# Altium footprint library USER_Lib.PcbLib: 102 footprints (part 2 of 7)
Each footprint in its own frame and in the unit in brackets; x right, y up, seen from the top. Pads: shape width x height; smd on the part's side, far side on the other; paste and mask are expansions set on the pad; w line width, h text height; cw(c..) or ccw(c..) is an arc to the next point about the centre after c.
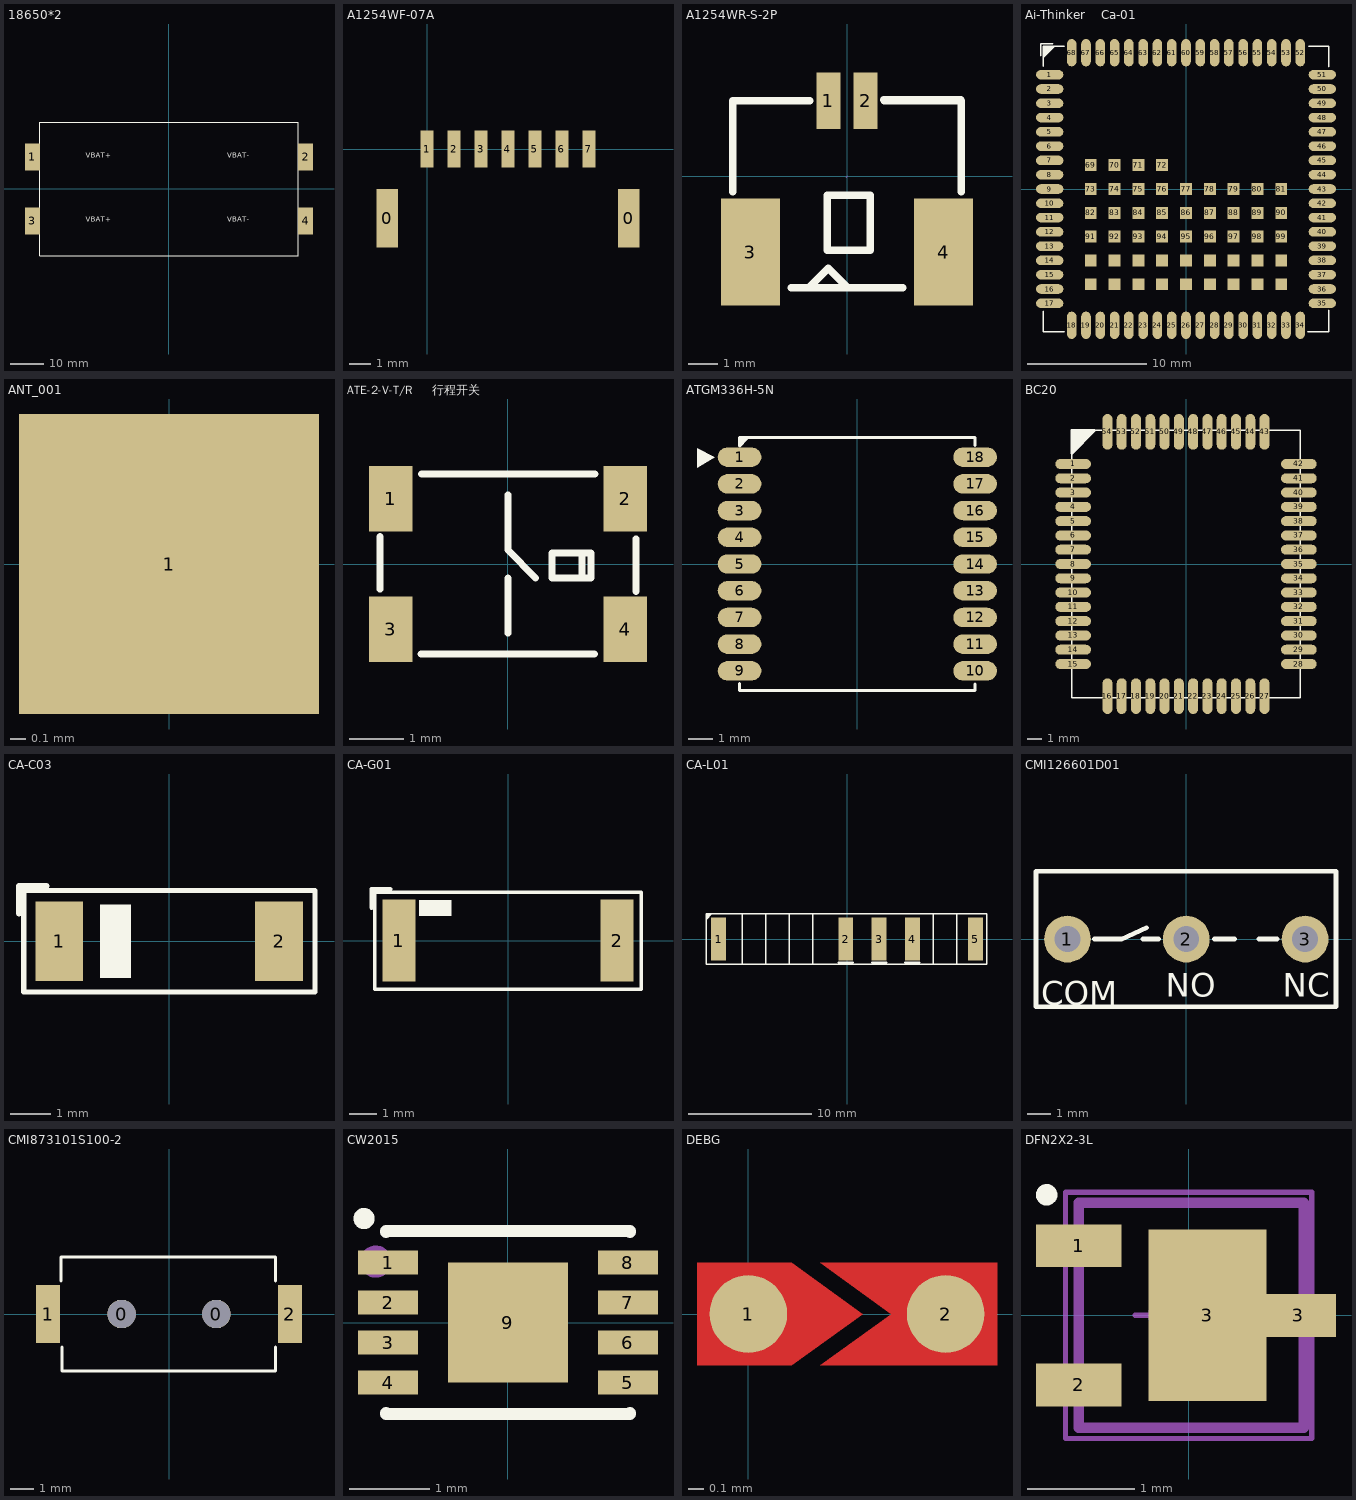
[diagram p1: the footprints below, top view; thin cyan lines are the x and y axes]

## 18650*2 [mm] "18650电池盒"
pads (4):
  rect 4.45x8 smd: 1(-40.775,9.55) 2(40.775,9.55) 3(-40.775,-9.55) 4(40.775,-9.55)
Top Overlay:
  lines w0.203: -38.55,-19.964 38.55,-19.964 38.55,19.95 -38.55,19.95 -38.55,-19.964
  text "VBAT+" at -24.88,8.736 h2.54
  text "VBAT-" at 17.405,8.736 h2.54
  text "VBAT+" at -24.88,-10.364 h2.54
  text "VBAT-" at 17.405,-10.364 h2.54

## A1254WF-07A [mm]
pads (9):
  rect 1x2.7 smd: 0(-1.85,-3.2) 0(9.35,-3.2)
  rect 0.6x1.7 smd: 1(0,0) 2(1.25,0) 3(2.5,0) 4(3.75,0) 5(5,0) 6(6.25,0) 7(7.5,0)
3D body "装配体2.STEP": height 4.45, standoff 0, extent -2.266,-4.533 9.734,0.198

## A1254WR-S-2P [mm] "长江连接器-卧式"
pads (4):
  rect 0.8x1.9 smd: 1(-0.625,2.55) 2(0.625,2.55)
  rect 2x3.6 smd: 3(-3.25,-2.55) 4(3.25,-2.55)
Top Overlay:
  lines w0.254: -1.875,-3.75 1.875,-3.75 ; -1.26,-3.711 -0.635,-3.086 -0.011,-3.711 ; 1.237,2.58 3.83,2.58 ; 1.256,2.55 3.849,2.55 ; -3.85,2.55 -3.85,-0.518 -3.85,2.55 ; -3.85,2.55 -1.257,2.55 -3.85,2.55 ; 3.849,2.55 3.849,-0.518 3.849,2.55 ; -0.665,-2.486 -0.665,-0.635 0.776,-0.635 0.776,-2.486 -0.665,-2.486
Mechanical 15:
  lines w0.003: -0.025,-0.033 0.025,0.018

## Ai-Thinker    Ca-01 [mm] "安信可4G物联网模块"
pads (117):
  oval 2.3x0.8 smd: 1(-11.45,9.6) 2(-11.45,8.4) 3(-11.45,7.2) 4(-11.45,6) 5(-11.45,4.8) 6(-11.45,3.6) 7(-11.45,2.4) 8(-11.45,1.2) 9(-11.45,0) 10(-11.45,-1.2) 11(-11.45,-2.4) 12(-11.45,-3.6) 13(-11.45,-4.8) 14(-11.45,-6) 15(-11.45,-7.2) 16(-11.45,-8.4) 17(-11.45,-9.6) 35(11.45,-9.6) 36(11.45,-8.4) 37(11.45,-7.2) 38(11.45,-6) 39(11.45,-4.8) 40(11.45,-3.6) 41(11.45,-2.4) 42(11.45,-1.2) 43(11.45,0) 44(11.45,1.2) 45(11.45,2.4) 46(11.45,3.6) 47(11.45,4.8) 48(11.45,6) 49(11.45,7.2) 50(11.45,8.4) 51(11.45,9.6)
  oval 0.8x2.3 smd: 18(-9.6,-11.45) 19(-8.4,-11.45) 20(-7.2,-11.45) 21(-6,-11.45) 22(-4.8,-11.45) 23(-3.6,-11.45) 24(-2.4,-11.45) 25(-1.2,-11.45) 26(0,-11.45) 27(1.2,-11.45) 28(2.4,-11.45) 29(3.6,-11.45) 30(4.8,-11.45) 31(6,-11.45) 32(7.2,-11.45) 33(8.4,-11.45) 34(9.6,-11.45) 52(9.6,11.45) 53(8.4,11.45) 54(7.2,11.45) 55(6,11.45) 56(4.8,11.45) 57(3.6,11.45) 58(2.4,11.45) 59(1.2,11.45) 60(0,11.45) 61(-1.2,11.45) 62(-2.4,11.45) 63(-3.6,11.45) 64(-4.8,11.45) 65(-6,11.45) 66(-7.2,11.45) 67(-8.4,11.45) 68(-9.6,11.45)
  rect 1x1 smd mask+0.102: 69(-8,2)
  rect 1x1 smd: 70(-6,2) 71(-4,2) 72(-2,2) 73(-8,0) 74(-6,0) 75(-4,0) 76(-2,0) 77(0,0) 78(2,0) 79(4,0) 80(6,0) 81(8,0) 82(-8,-2) 83(-6,-2) 84(-4,-2) 85(-2,-2) 86(0,-2) 87(2,-2) 88(4,-2) 89(6,-2) 90(8,-2) 91(-8,-4) 92(-6,-4) 93(-4,-4) 94(-2,-4) 95(0,-4) 96(2,-4) 97(4,-4) 98(6,-4) 99(8,-4) 100(-8,-6) 101(-6,-6) 102(-4,-6) 103(-2,-6) 104(0,-6) 105(2,-6) 106(4,-6) 107(6,-6) 108(8,-6) 109(-8,-8) 110(-6,-8) 111(-4,-8) 112(-2,-8) 113(0,-8) 114(2,-8) 115(4,-8) 116(6,-8) 117(8,-8)
Top Overlay:
  region: -12,12 -10.976,12 -12,10.976
  lines w0.127: -12.2,11.176 -12.2,12.2 -11.176,12.2 ; -12,-10.287 -12,-12 -10.218,-12 ; -12,10.302 -12,12 -10.248,12 ; 10.213,-12 12,-12 12,-10.204 ; 10.292,12 12,12 12,10.287
3D body "Ca-01.STEP": height 2.3, standoff 0, extent -12,-12 12,12

## ANT_001 [mm]
pads (1):
  rect 2x2 smd mask+0.102: 1(0,0)

## ATE-2-V-T/R     行程开关 [mm] "行程开关"
pads (4):
  rect 0.8x1.2 smd mask+0.102: 1(-2.15,1.2) 2(2.15,1.2) 3(-2.15,-1.2) 4(2.15,-1.2)
Top Overlay:
  lines w0.127: -2.35,-0.463 -2.35,0.508 ; -1.597,-1.65 0,-1.65 1.59,-1.65 ; -1.587,1.65 0,1.65 1.594,1.65 ; 0,-1.27 0,-0.254 ; 0,1.27 0,0.508 0,0.254 0.508,-0.254 ; 1.353,0.202 1.355,0.202 1.355,-0.242 ; 2.35,-0.508 2.35,0.463 ; 0.806,-0.254 1.524,-0.254 1.524,0.204 0.806,0.204 0.806,-0.254

## ATGM336H-5N [mm] "GPS模块"
pads (18):
  rrect100% 1.8x0.8 smd mask+0.102: 1(-4.85,4.4) 2(-4.85,3.3) 3(-4.85,2.2) 4(-4.85,1.1) 5(-4.85,0) 6(-4.85,-1.1) 7(-4.85,-2.2) 8(-4.85,-3.3) 9(-4.85,-4.4) 10(4.85,-4.4) 11(4.85,-3.3) 12(4.85,-2.2) 13(4.85,-1.1) 14(4.85,0) 15(4.85,1.1) 16(4.85,2.2) 17(4.85,3.3) 18(4.85,4.4)
Top Overlay:
  region: -6.604,3.962 -5.865,4.406 -6.604,4.775
  lines w0.127: -4.851,-4.928 -4.851,-5.207 -4.85,-5.207 ; -4.826,-5.207 -4.85,-5.207 ; -4.701,5.016 -4.855,5.08 ; 4.85,-4.953 4.85,-5.207 -4.85,-5.207 ; 4.85,4.877 4.85,5.207 -4.855,5.207 -4.855,5.08 ; -4.855,5.08 -4.855,4.851 -4.547,5.182 -4.855,5.08

## BC20 [mm]
pads (54):
  oval 2.5x0.7 smd mask+0.05: 1(-7.9,7) 2(-7.9,6) 3(-7.9,5) 4(-7.9,4) 5(-7.9,3) 6(-7.9,2) 7(-7.9,1) 8(-7.9,0) 9(-7.9,-1) 10(-7.9,-2) 11(-7.9,-3) 12(-7.9,-4) 13(-7.9,-5) 14(-7.9,-6) 15(-7.9,-7) 28(7.9,-7) 29(7.9,-6) 30(7.9,-5) 31(7.9,-4) 32(7.9,-3) 33(7.9,-2) 34(7.9,-1) 35(7.9,0) 36(7.9,1) 37(7.9,2) 38(7.9,3) 39(7.9,4) 40(7.9,5) 41(7.9,6) 42(7.9,7)
  oval 0.7x2.5 smd mask+0.05: 16(-5.5,-9.25) 17(-4.5,-9.25) 18(-3.5,-9.25) 19(-2.5,-9.25) 20(-1.5,-9.25) 21(-0.5,-9.25) 22(0.5,-9.25) 23(1.5,-9.25) 24(2.5,-9.25) 25(3.5,-9.25) 26(4.5,-9.25) 27(5.5,-9.25) 43(5.5,9.25) 44(4.5,9.25) 45(3.5,9.25) 46(2.5,9.25) 47(1.5,9.25) 48(0.5,9.25) 49(-0.5,9.25) 50(-1.5,9.25) 51(-2.5,9.25) 52(-3.5,9.25) 53(-4.5,9.25) 54(-5.5,9.25)
Top Overlay:
  region: -8,7.75 -6.4,9.35 -8,9.35
  lines w0.1: -8,-9.35 -8,9.35 8,9.35 8,-9.35 -8,-9.35
  lines w0.203: -8,7.75 -6.4,9.35 -8,9.35 -8,7.75
3D body "BC20.STEP": height 2.1, standoff 0, extent -8,-9.35 8,9.35

## CA-C03 [mm] "2.4G  ISM  BLE  WIFI  ZigBee  贴片天线"
pads (2):
  rect 1.2x2 smd mask+0.102: 1(-2.75,0) 2(2.75,0)
Top Overlay:
  region: -1.727,-0.914 -1.727,0.914 -0.965,0.914 -0.965,-0.914
  lines w0.127: -3.639,-1.27 3.654,-1.27 3.654,1.27 -3.639,1.27 -3.639,-1.27
  lines w0.152: -3.757,0.698 -3.757,1.383 -3.071,1.383
3D body "CA-C03.STEP": height 1.01, standoff 0, extent -2.75,-1 2.75,1

## CA-G01 [mm] "GNSS贴片天线"
pads (2):
  rect 1.2x3 smd mask+0.102: 1(-4,0) 2(4,0)
Top Overlay:
  region: -3.251,0.914 -3.251,1.473 -2.083,1.473 -2.083,0.914
  lines w0.127: -4.889,-1.778 -4.889,1.778 -4,1.778 4.001,1.778 4.89,1.778 4.89,-1.778 4.001,-1.778 -4,-1.778 -4.889,-1.778
  lines w0.152: -5.001,1.205 -5.001,1.891 -4.315,1.891
3D body "CA-G01.STEP": height 1.01, standoff 0, extent -4,-1.5 4,1.5

## CA-L01 [mm] "4G  3G  2G  全网通天线"
pads (5):
  rect 1.2x3.5 smd mask+0.102: 1(-10.4,0) 2(-0.1,0) 3(2.6,0) 4(5.3,0) 5(10.4,0)
Top Overlay:
  region: -11.416,1.538 -10.922,2.032 -11.416,2.032
  lines w0.127: -8.495,-2.032 -8.495,2.032 ; -6.59,-2.032 -6.59,2.032 ; -4.685,-2.032 -4.685,2.032 ; -2.78,-2.032 -2.78,2.032 ; 6.999,-2.032 6.999,2.032 ; 8.904,-2.032 8.904,2.032 ; -11.416,-2.032 11.317,-2.032 11.317,2.032 -11.162,2.032 -11.416,2.032 -11.416,-2.032
  lines w0.152: -0.7,-1.903 0.496,-1.903 ; 2.001,-1.906 3.196,-1.906 ; 4.698,-1.916 5.893,-1.916
3D body "L01.STEP": height 1.61, standoff 0, extent -11.5,-1.75 11.5,1.75

## CMI126601D01 [mm] "Kailh小型微动开关"
pads (3):
  round 2 hole 1.1: 1(-5.08,0) 2(0,0) 3(5.08,0)
Top Overlay:
  lines w0.203: -3.937,0 -2.769,0 -1.702,0.483 ; -1.854,0 -1.194,0 ; 1.194,0 2.057,0 ; 3.099,0 3.886,0 ; -6.426,-2.896 6.401,-2.896 6.401,2.901 -6.426,2.901 -6.426,-2.896
  text "NC" at 4.115,-2.464 h1.02
  text "NO" at -0.889,-2.464 h1.02
  text "COM" at -6.198,-2.802 h1.02
3D body "凯华电子 CMI126601D01 60M微动开关.STEP": height 7.1, standoff -3.2, extent -6.4,-2.9 6.4,2.9

## CMI873101S100-2 [mm]
pads (4):
  round 1.2 hole 1.2 unplated: 0(-2,0) 0(2,0)
  rect 1x2.45 smd: 1(-5.1,0) 2(5.1,0)
Top Overlay:
  lines w0.127: -4.547,1.392 -4.547,2.4 4.496,2.4 4.496,1.393 ; -4.502,-1.393 -4.502,-2.4 4.496,-2.4 4.496,-1.392
3D body "Kailh.STEP": height 3.5, standoff -1, extent -5.593,-2.4 5.607,2.4

## CW2015 [mm]
pads (9):
  rect 0.75x0.3 smd: 1(-1.5,0.75) 2(-1.5,0.249) 3(-1.5,-0.25) 4(-1.5,-0.75) 5(1.5,-0.75) 6(1.5,-0.25) 7(1.5,0.249) 8(1.5,0.75)
  rect 1.5x1.5 smd: 9(0,0)
Top Overlay:
  circle w0.15: c-1.8,1.3 r0.057
  lines w0.15: -1.524,-1.129 -1.524,-1.143 1.524,-1.143 1.524,-1.129 ; -1.524,1.129 -1.524,1.143 1.524,1.143 1.524,1.129
Mechanical 15:
  circle w0.2: c-1.651,0.762 r0.1

## DEBG [mm] "调试断点"
pads (2):
  round 0.5 smd mask+0.102: 1(0,0) 2(1.27,0)
Top Layer:
  region: -0.33,-0.33 -0.33,0.33 0.279,0.33 0.737,0 0.279,-0.33
  region: 0.463,-0.33 1.6,-0.33 1.6,0.33 0.463,0.33 0.921,0

## DFN2X2-3L [mm] "DFN, 3-Leads, Body 2.00x2.00mm, Pitch 2.10mm, IPC High Density"
height 0.65
pads (4):
  rect 0.8x0.4 smd: 1(-1.025,0.65) 2(-1.025,-0.65)
  rect 1.1x1.6 smd: 3(0.175,0)
  rect 0.7x0.4 smd: 3(1.025,0)
Top Overlay:
  circle w0.1: c-1.325,1.125 r0.05
Mechanical 13:
  lines w0.1: -1.025,-1.05 1.075,-1.05 1.075,1.05 -1.025,1.05 -1.025,-1.05
Mechanical 15:
  circle w0.05: c0,0 r0.35
  lines w0.05: -0.5,0 0.5,0 ; 0,-0.5 0,0.5 ; -1.15,-1.15 1.15,-1.15 1.15,1.15 -1.15,1.15 -1.15,-1.15
3D body "DFN172P200X65-3L.step": height 0.65, standoff 0, extent -1.1,-1.05 1.15,1.05